# Altium footprint library domino-spring-clamp.PcbLib: 258 footprints (part 6 of 17)
Each footprint in its own frame and in the unit in brackets; x right, y up, seen from the top. Pads: shape width x height; smd on the part's side, far side on the other; paste and mask are expansions set on the pad; w line width, h text height; cw(c..) or ccw(c..) is an arc to the next point about the centre after c.
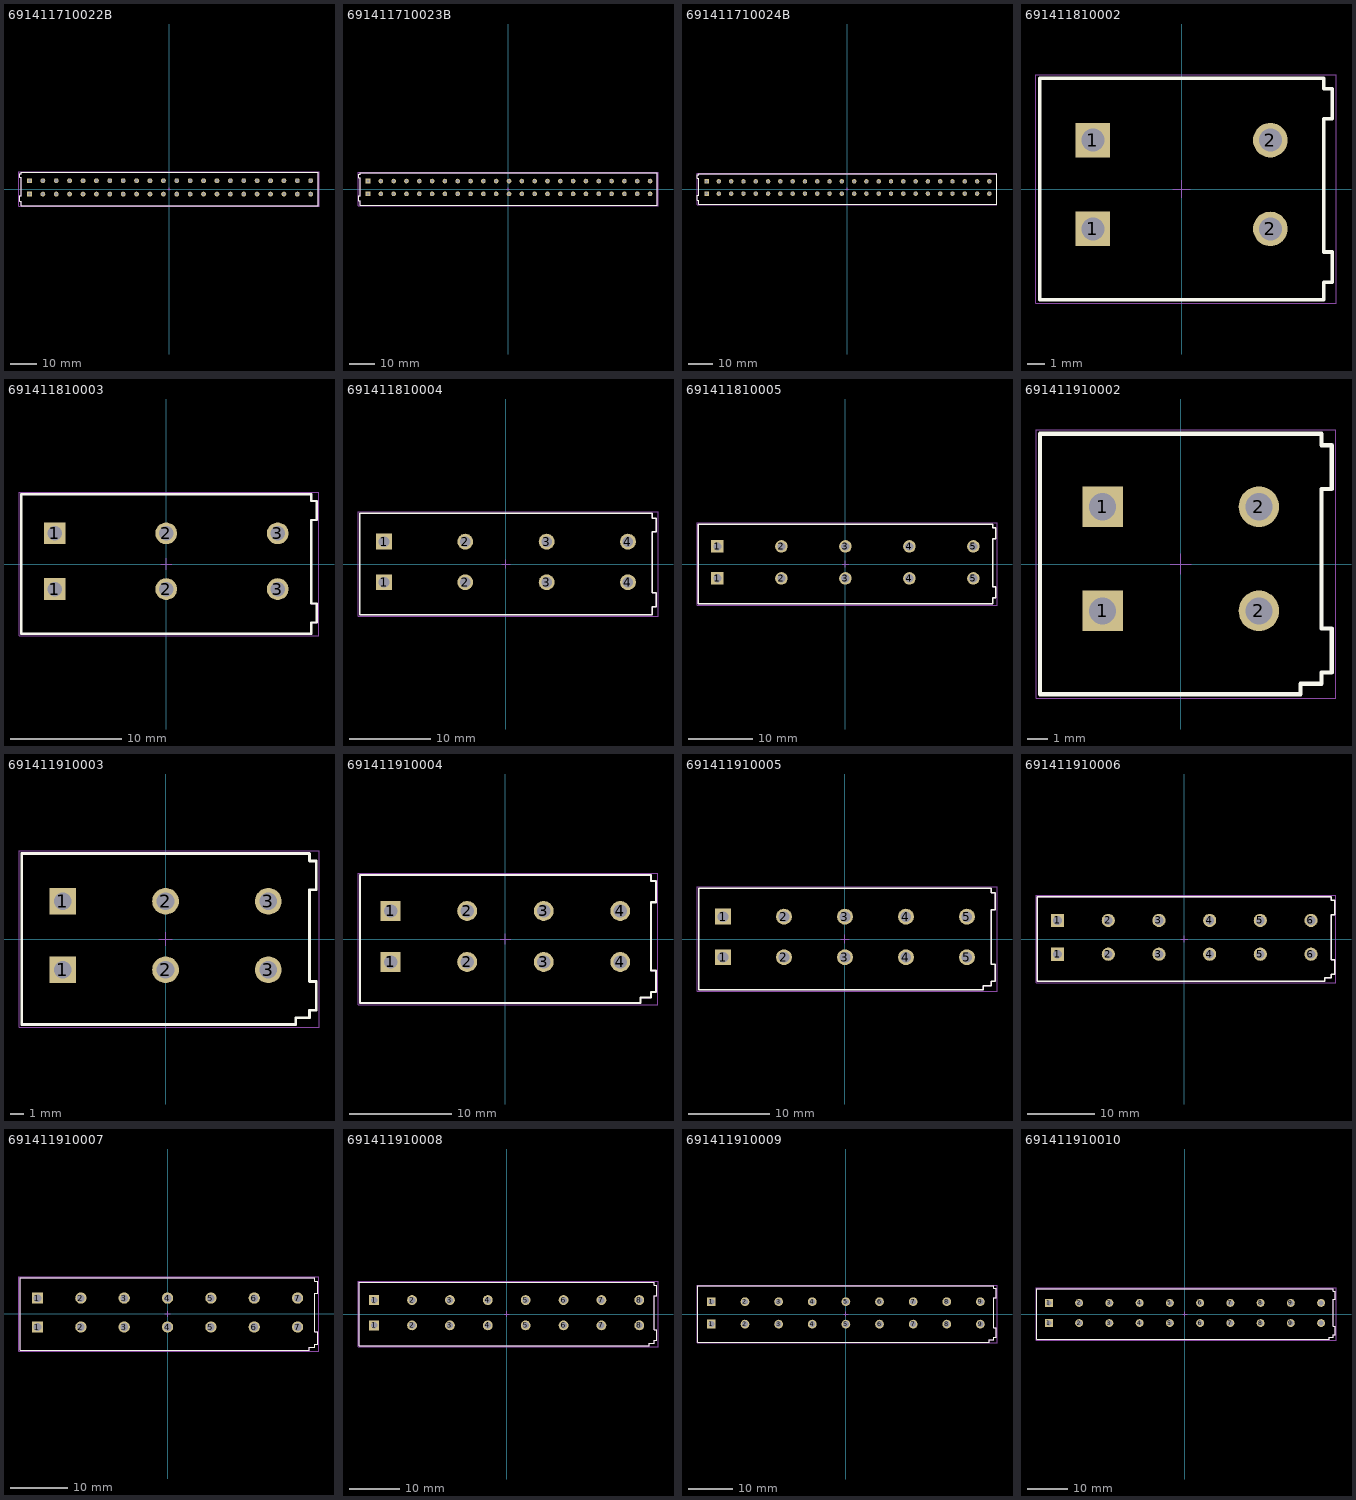
[diagram p5: the footprints below, top view; thin cyan lines are the x and y axes]

## 691411710022B [mm] "5.00 mm Screwless Horizontal Entry - 2.0 mm2 Wires, 22p"
height 15.25
pads (44):
  rect 1.8x1.8 hole 1.2: 1(-52.1,-1.9) 1(-52.1,3.1)
  round 1.8 hole 1.2: 2(-47.1,-1.9) 2(-47.1,3.1) 3(-42.1,-1.9) 3(-42.1,3.1) 4(-37.1,-1.9) 4(-37.1,3.1) 5(-32.1,-1.9) 5(-32.1,3.1) 6(-27.1,-1.9) 6(-27.1,3.1) 7(-22.1,-1.9) 7(-22.1,3.1) 8(-17.1,-1.9) 8(-17.1,3.1) 9(-12.1,-1.9) 9(-12.1,3.1) 10(-7.1,-1.9) 10(-7.1,3.1) 11(-2.1,-1.9) 11(-2.1,3.1) 12(2.9,-1.9) 12(2.9,3.1) 13(7.9,-1.9) 13(7.9,3.1) 14(12.9,-1.9) 14(12.9,3.1) 15(17.9,-1.9) 15(17.9,3.1) 16(22.9,-1.9) 16(22.9,3.1) 17(27.9,-1.9) 17(27.9,3.1) 18(32.9,-1.9) 18(32.9,3.1) 19(37.9,-1.9) 19(37.9,3.1) 20(42.9,-1.9) 20(42.9,3.1) 21(47.9,-1.9) 21(47.9,3.1) 22(52.9,-1.9) 22(52.9,3.1)
Top Overlay:
  lines w0.2: -55.8,-4.6 -55.8,-2.55 -55.2,-2.55 -55.2,4.3 -55.8,4.3 -55.8,5.7 -55.2,5.7 -55.2,6.3 55.8,6.3 55.8,-6.3 -55.2,-6.3 -55.2,-4.6 -55.8,-4.6
Mechanical 13:
  lines w0.1: -55.8,-4.6 -55.2,-4.6 -55.2,-6.3 55.8,-6.3 55.8,6.3 -55.2,6.3 -55.2,5.7 -55.8,5.7 -55.8,4.3 -55.2,4.3 -55.2,-2.55 -55.8,-2.55 -55.8,-4.6
Mechanical 15:
  lines w0.05: -0.5,0 0.5,0 ; 0,-0.5 0,0.5 ; -56,-6.5 -56,6.5 56,6.5 56,-6.5 -56,-6.5
3D body "691411710022B.stp": height 15.65, standoff -3.55, extent -55.8,-6.3 55.8,6.3

## 691411710023B [mm] "5.00 mm Screwless Horizontal Entry - 2.0 mm2 Wires, 23p"
height 15.25
pads (46):
  rect 1.8x1.8 hole 1.2: 1(-54.6,-1.9) 1(-54.6,3.1)
  round 1.8 hole 1.2: 2(-49.6,-1.9) 2(-49.6,3.1) 3(-44.6,-1.9) 3(-44.6,3.1) 4(-39.6,-1.9) 4(-39.6,3.1) 5(-34.6,-1.9) 5(-34.6,3.1) 6(-29.6,-1.9) 6(-29.6,3.1) 7(-24.6,-1.9) 7(-24.6,3.1) 8(-19.6,-1.9) 8(-19.6,3.1) 9(-14.6,-1.9) 9(-14.6,3.1) 10(-9.6,-1.9) 10(-9.6,3.1) 11(-4.6,-1.9) 11(-4.6,3.1) 12(0.4,-1.9) 12(0.4,3.1) 13(5.4,-1.9) 13(5.4,3.1) 14(10.4,-1.9) 14(10.4,3.1) 15(15.4,-1.9) 15(15.4,3.1) 16(20.4,-1.9) 16(20.4,3.1) 17(25.4,-1.9) 17(25.4,3.1) 18(30.4,-1.9) 18(30.4,3.1) 19(35.4,-1.9) 19(35.4,3.1) 20(40.4,-1.9) 20(40.4,3.1) 21(45.4,-1.9) 21(45.4,3.1) 22(50.4,-1.9) 22(50.4,3.1) 23(55.4,-1.9) 23(55.4,3.1)
Top Overlay:
  lines w0.2: -58.3,-4.6 -58.3,-2.55 -57.7,-2.55 -57.7,4.3 -58.3,4.3 -58.3,5.7 -57.7,5.7 -57.7,6.3 58.3,6.3 58.3,-6.3 -57.7,-6.3 -57.7,-4.6 -58.3,-4.6
Mechanical 13:
  lines w0.1: -58.3,-4.6 -57.7,-4.6 -57.7,-6.3 58.3,-6.3 58.3,6.3 -57.7,6.3 -57.7,5.7 -58.3,5.7 -58.3,4.3 -57.7,4.3 -57.7,-2.55 -58.3,-2.55 -58.3,-4.6
Mechanical 15:
  lines w0.05: -0.5,0 0.5,0 ; 0,-0.5 0,0.5 ; -58.5,-6.5 -58.5,6.5 58.5,6.5 58.5,-6.5 -58.5,-6.5
3D body "691411710023B.stp": height 15.65, standoff -3.55, extent -58.3,-6.3 58.3,6.3

## 691411710024B [mm] "5.00 mm Screwless Horizontal Entry - 2.0 mm2 Wires, 24p"
height 15.25
pads (48):
  rect 1.8x1.8 hole 1.2: 1(-57.1,-1.9) 1(-57.1,3.1)
  round 1.8 hole 1.2: 2(-52.1,-1.9) 2(-52.1,3.1) 3(-47.1,-1.9) 3(-47.1,3.1) 4(-42.1,-1.9) 4(-42.1,3.1) 5(-37.1,-1.9) 5(-37.1,3.1) 6(-32.1,-1.9) 6(-32.1,3.1) 7(-27.1,-1.9) 7(-27.1,3.1) 8(-22.1,-1.9) 8(-22.1,3.1) 9(-17.1,-1.9) 9(-17.1,3.1) 10(-12.1,-1.9) 10(-12.1,3.1) 11(-7.1,-1.9) 11(-7.1,3.1) 12(-2.1,-1.9) 12(-2.1,3.1) 13(2.9,-1.9) 13(2.9,3.1) 14(7.9,-1.9) 14(7.9,3.1) 15(12.9,-1.9) 15(12.9,3.1) 16(17.9,-1.9) 16(17.9,3.1) 17(22.9,-1.9) 17(22.9,3.1) 18(27.9,-1.9) 18(27.9,3.1) 19(32.9,-1.9) 19(32.9,3.1) 20(37.9,-1.9) 20(37.9,3.1) 21(42.9,-1.9) 21(42.9,3.1) 22(47.9,-1.9) 22(47.9,3.1) 23(52.9,-1.9) 23(52.9,3.1) 24(57.9,-1.9) 24(57.9,3.1)
Top Overlay:
  lines w0.2: -60.8,-4.6 -60.8,-2.55 -60.2,-2.55 -60.2,4.3 -60.8,4.3 -60.8,5.7 -60.2,5.7 -60.2,6.3 60.8,6.3 60.8,-6.3 -60.2,-6.3 -60.2,-4.6 -60.8,-4.6
Mechanical 13:
  lines w0.1: -60.8,-4.6 -60.2,-4.6 -60.2,-6.3 60.8,-6.3 60.8,6.3 -60.2,6.3 -60.2,5.7 -60.8,5.7 -60.8,4.3 -60.2,4.3 -60.2,-2.55 -60.8,-2.55 -60.8,-4.6
Mechanical 15:
  lines w0.05: -0.5,0 0.5,0 ; 0,-0.5 0,0.5 ; -61,-6.5 -61,6.5 61,6.5 61,-6.5 -61,-6.5
3D body "691411710024B.stp": height 15.65, standoff -3.55, extent -60.8,-6.3 60.8,6.3

## 691411810002 [mm] "10.00mm Horizontal Cable Entry Screwless, 02p"
height 13.9
pads (4):
  rect 1.95x1.95 hole 1.3: 1(-5,-2.25) 1(-5,2.75)
  round 1.95 hole 1.3: 2(5,-2.25) 2(5,2.75)
Top Overlay:
  lines w0.2: -8,-6.25 -8,6.25 8,6.25 8,5.65 8.5,5.65 8.5,3.95 8,3.95 8,-3.55 8.5,-3.55 8.5,-5.25 8,-5.25 8,-6.25 -8,-6.25
Mechanical 13:
  lines w0.1: -8,-6.25 8,-6.25 8,-5.25 8.5,-5.25 8.5,-3.55 8,-3.55 8,3.95 8.5,3.95 8.5,5.65 8,5.65 8,6.25 -8,6.25 -8,-6.25
Mechanical 15:
  lines w0.05: -0.5,0 0.5,0 ; 0,-0.5 0,0.5 ; -8.2,-6.45 -8.2,6.45 8.7,6.45 8.7,-6.45 -8.2,-6.45
3D body "691411810002.stp": height 14, standoff -3.5, extent -8,-6.25 8.5,6.25

## 691411810003 [mm] "10.00mm Horizontal Cable Entry Screwless, 03p"
height 13.9
pads (6):
  rect 1.95x1.95 hole 1.3: 1(-10,-2.25) 1(-10,2.75)
  round 1.95 hole 1.3: 2(0,-2.25) 2(0,2.75) 3(10,-2.25) 3(10,2.75)
Top Overlay:
  lines w0.2: -13,-6.25 13,-6.25 13,-5.25 13.5,-5.25 13.5,-3.55 13,-3.55 13,3.95 13.5,3.95 13.5,5.65 13,5.65 13,6.25 -13,6.25 -13,-6.25
Mechanical 13:
  lines w0.1: -13,-6.25 -13,6.25 13,6.25 13,5.65 13.5,5.65 13.5,3.95 13,3.95 13,-3.55 13.5,-3.55 13.5,-5.25 13,-5.25 13,-6.25 -13,-6.25
Mechanical 15:
  lines w0.05: -0.5,0 0.5,0 ; 0,-0.5 0,0.5 ; -13.2,-6.45 13.7,-6.45 13.7,6.45 -13.2,6.45 -13.2,-6.45
3D body "691411810003.stp": height 14, standoff -3.5, extent -13,-6.25 13.5,6.25

## 691411810004 [mm] "10.00mm Horizontal Cable Entry Screwless, 04p"
height 13.9
pads (8):
  rect 1.95x1.95 hole 1.3: 1(-15,-2.25) 1(-15,2.75)
  round 1.95 hole 1.3: 2(-5,-2.25) 2(-5,2.75) 3(5,-2.25) 3(5,2.75) 4(15,-2.25) 4(15,2.75)
Top Overlay:
  lines w0.2: -18,-6.25 18,-6.25 18,-5.25 18.5,-5.25 18.5,-3.55 18,-3.55 18,3.95 18.5,3.95 18.5,5.65 18,5.65 18,6.25 -18,6.25 -18,-6.25
Mechanical 13:
  lines w0.1: -18,-6.25 -18,6.25 18,6.25 18,5.65 18.5,5.65 18.5,3.95 18,3.95 18,-3.55 18.5,-3.55 18.5,-5.25 18,-5.25 18,-6.25 -18,-6.25
Mechanical 15:
  lines w0.05: -0.5,0 0.5,0 ; 0,-0.5 0,0.5 ; -18.2,-6.45 18.7,-6.45 18.7,6.45 -18.2,6.45 -18.2,-6.45
3D body "691411810004.stp": height 14, standoff -3.5, extent -18,-6.25 18.5,6.25

## 691411810005 [mm] "10.00mm Horizontal Cable Entry Screwless, 05p"
height 13.9
pads (10):
  rect 1.95x1.95 hole 1.3: 1(-20,-2.25) 1(-20,2.75)
  round 1.95 hole 1.3: 2(-10,-2.25) 2(-10,2.75) 3(0,-2.25) 3(0,2.75) 4(10,-2.25) 4(10,2.75) 5(20,-2.25) 5(20,2.75)
Top Overlay:
  lines w0.2: -23,-6.25 -23,6.25 23,6.25 23,5.65 23.5,5.65 23.5,3.95 23,3.95 23,-3.55 23.5,-3.55 23.5,-5.25 23,-5.25 23,-6.25 -23,-6.25
Mechanical 13:
  lines w0.1: -23,-6.25 23,-6.25 23,-5.25 23.5,-5.25 23.5,-3.55 23,-3.55 23,3.95 23.5,3.95 23.5,5.65 23,5.65 23,6.25 -23,6.25 -23,-6.25
Mechanical 15:
  lines w0.05: -0.5,0 0.5,0 ; 0,-0.5 0,0.5 ; -23.2,-6.45 -23.2,6.45 23.7,6.45 23.7,-6.45 -23.2,-6.45
3D body "691411810005.stp": height 14, standoff -3.5, extent -23,-6.25 23.5,6.25

## 691411910002 [mm] "7.50 mm Screwless Horizontal Entry, 2p"
height 13.9
pads (4):
  rect 1.95x1.95 hole 1.3: 1(-3.75,-2.25) 1(-3.75,2.75)
  round 1.95 hole 1.3: 2(3.75,-2.25) 2(3.75,2.75)
Top Overlay:
  lines w0.2: -6.75,-6.25 -6.75,6.25 6.75,6.25 6.75,5.7 7.25,5.7 7.25,3.6 6.75,3.6 6.75,-3.1 7.25,-3.1 7.25,-5.2 6.75,-5.2 6.75,-5.75 5.75,-5.75 5.75,-6.25 -6.75,-6.25
Mechanical 13:
  lines w0.1: -6.75,-6.25 5.75,-6.25 5.75,-5.75 6.75,-5.75 6.75,-5.2 7.25,-5.2 7.25,-3.1 6.75,-3.1 6.75,3.6 7.25,3.6 7.25,5.7 6.75,5.7 6.75,6.25 -6.75,6.25 -6.75,-6.25
Mechanical 15:
  lines w0.05: -0.5,0 0.5,0 ; 0,-0.5 0,0.5 ; -6.95,-6.45 -6.95,6.45 7.45,6.45 7.45,-6.45 -6.95,-6.45
3D body "691411910002.stp": height 13.95, standoff -3.55, extent -6.75,-6.25 7.25,6.25

## 691411910003 [mm] "7.50 mm Screwless Horizontal Entry, 3p"
height 13.9
pads (6):
  rect 1.95x1.95 hole 1.3: 1(-7.5,-2.25) 1(-7.5,2.75)
  round 1.95 hole 1.3: 2(0,-2.25) 2(0,2.75) 3(7.5,-2.25) 3(7.5,2.75)
Top Overlay:
  lines w0.2: -10.5,-6.25 9.5,-6.25 9.5,-5.75 10.5,-5.75 10.5,-5.2 11,-5.2 11,-3.1 10.5,-3.1 10.5,3.6 11,3.6 11,5.7 10.5,5.7 10.5,6.25 -10.5,6.25 -10.5,-6.25
Mechanical 13:
  lines w0.1: -10.5,-6.25 -10.5,6.25 10.5,6.25 10.5,5.7 11,5.7 11,3.6 10.5,3.6 10.5,-3.1 11,-3.1 11,-5.2 10.5,-5.2 10.5,-5.75 9.5,-5.75 9.5,-6.25 -10.5,-6.25
Mechanical 15:
  lines w0.05: -0.5,0 0.5,0 ; 0,-0.5 0,0.5 ; -10.7,-6.45 11.2,-6.45 11.2,6.45 -10.7,6.45 -10.7,-6.45
3D body "691411910003.stp": height 13.95, standoff -3.55, extent -10.5,-6.25 11,6.25

## 691411910004 [mm] "7.50 mm Screwless Horizontal Entry, 4p"
height 13.9
pads (8):
  rect 1.95x1.95 hole 1.3: 1(-11.25,-2.25) 1(-11.25,2.75)
  round 1.95 hole 1.3: 2(-3.75,-2.25) 2(-3.75,2.75) 3(3.75,-2.25) 3(3.75,2.75) 4(11.25,-2.25) 4(11.25,2.75)
Top Overlay:
  lines w0.2: -14.25,-6.25 -14.25,6.25 14.25,6.25 14.25,5.7 14.75,5.7 14.75,3.6 14.25,3.6 14.25,-3.1 14.75,-3.1 14.75,-5.2 14.25,-5.2 14.25,-5.75 13.25,-5.75 13.25,-6.25 -14.25,-6.25
Mechanical 13:
  lines w0.1: -14.25,-6.25 13.25,-6.25 13.25,-5.75 14.25,-5.75 14.25,-5.2 14.75,-5.2 14.75,-3.1 14.25,-3.1 14.25,3.6 14.75,3.6 14.75,5.7 14.25,5.7 14.25,6.25 -14.25,6.25 -14.25,-6.25
Mechanical 15:
  lines w0.05: -0.5,0 0.5,0 ; 0,-0.5 0,0.5 ; -14.45,-6.45 -14.45,6.45 14.95,6.45 14.95,-6.45 -14.45,-6.45
3D body "691411910004.stp": height 13.95, standoff -3.55, extent -14.25,-6.25 14.75,6.25

## 691411910005 [mm] "7.50 mm Screwless Horizontal Entry, 5p"
height 13.9
pads (10):
  rect 1.95x1.95 hole 1.3: 1(-15,-2.25) 1(-15,2.75)
  round 1.95 hole 1.3: 2(-7.5,-2.25) 2(-7.5,2.75) 3(0,-2.25) 3(0,2.75) 4(7.5,-2.25) 4(7.5,2.75) 5(15,-2.25) 5(15,2.75)
Top Overlay:
  lines w0.2: -18,-6.25 -18,6.25 18,6.25 18,5.7 18.5,5.7 18.5,3.6 18,3.6 18,-3.1 18.5,-3.1 18.5,-5.2 18,-5.2 18,-5.75 17,-5.75 17,-6.25 -18,-6.25
Mechanical 13:
  lines w0.1: -18,-6.25 17,-6.25 17,-5.75 18,-5.75 18,-5.2 18.5,-5.2 18.5,-3.1 18,-3.1 18,3.6 18.5,3.6 18.5,5.7 18,5.7 18,6.25 -18,6.25 -18,-6.25
Mechanical 15:
  lines w0.05: -0.5,0 0.5,0 ; 0,-0.5 0,0.5 ; -18.2,-6.45 -18.2,6.45 18.7,6.45 18.7,-6.45 -18.2,-6.45
3D body "691411910005.stp": height 13.95, standoff -3.55, extent -18,-6.25 18.5,6.25

## 691411910006 [mm] "7.50 mm Screwless Horizontal Entry, 6p"
height 13.9
pads (12):
  rect 1.95x1.95 hole 1.3: 1(-18.75,-2.25) 1(-18.75,2.75)
  round 1.95 hole 1.3: 2(-11.25,-2.25) 2(-11.25,2.75) 3(-3.75,-2.25) 3(-3.75,2.75) 4(3.75,-2.25) 4(3.75,2.75) 5(11.25,-2.25) 5(11.25,2.75) 6(18.75,-2.25) 6(18.75,2.75)
Top Overlay:
  lines w0.2: -21.75,-6.25 20.75,-6.25 20.75,-5.75 21.75,-5.75 21.75,-5.2 22.25,-5.2 22.25,-3.1 21.75,-3.1 21.75,3.6 22.25,3.6 22.25,5.7 21.75,5.7 21.75,6.25 -21.75,6.25 -21.75,-6.25
Mechanical 13:
  lines w0.1: -21.75,-6.25 -21.75,6.25 21.75,6.25 21.75,5.7 22.25,5.7 22.25,3.6 21.75,3.6 21.75,-3.1 22.25,-3.1 22.25,-5.2 21.75,-5.2 21.75,-5.75 20.75,-5.75 20.75,-6.25 -21.75,-6.25
Mechanical 15:
  lines w0.05: -0.5,0 0.5,0 ; 0,-0.5 0,0.5 ; -21.95,-6.45 22.45,-6.45 22.45,6.45 -21.95,6.45 -21.95,-6.45
3D body "691411910006.stp": height 13.95, standoff -3.55, extent -21.75,-6.25 22.25,6.25

## 691411910007 [mm] "7.50 mm Screwless Horizontal Entry, 7p"
height 13.9
pads (14):
  rect 1.95x1.95 hole 1.3: 1(-22.5,-2.25) 1(-22.5,2.75)
  round 1.95 hole 1.3: 2(-15,-2.25) 2(-15,2.75) 3(-7.5,-2.25) 3(-7.5,2.75) 4(0,-2.25) 4(0,2.75) 5(7.5,-2.25) 5(7.5,2.75) 6(15,-2.25) 6(15,2.75) 7(22.5,-2.25) 7(22.5,2.75)
Top Overlay:
  lines w0.2: -25.5,-6.25 -25.5,6.25 25.5,6.25 25.5,5.7 26,5.7 26,3.6 25.5,3.6 25.5,-3.1 26,-3.1 26,-5.2 25.5,-5.2 25.5,-5.75 24.5,-5.75 24.5,-6.25 -25.5,-6.25
Mechanical 13:
  lines w0.1: -25.5,-6.25 24.5,-6.25 24.5,-5.75 25.5,-5.75 25.5,-5.2 26,-5.2 26,-3.1 25.5,-3.1 25.5,3.6 26,3.6 26,5.7 25.5,5.7 25.5,6.25 -25.5,6.25 -25.5,-6.25
Mechanical 15:
  lines w0.05: -0.5,0 0.5,0 ; 0,-0.5 0,0.5 ; -25.7,-6.45 -25.7,6.45 26.2,6.45 26.2,-6.45 -25.7,-6.45
3D body "691411910007.stp": height 13.95, standoff -3.55, extent -25.5,-6.25 26,6.25

## 691411910008 [mm] "7.50 mm Screwless Horizontal Entry, 8p"
height 13.9
pads (16):
  rect 1.95x1.95 hole 1.3: 1(-26.25,-2.25) 1(-26.25,2.75)
  round 1.95 hole 1.3: 2(-18.75,-2.25) 2(-18.75,2.75) 3(-11.25,-2.25) 3(-11.25,2.75) 4(-3.75,-2.25) 4(-3.75,2.75) 5(3.75,-2.25) 5(3.75,2.75) 6(11.25,-2.25) 6(11.25,2.75) 7(18.75,-2.25) 7(18.75,2.75) 8(26.25,-2.25) 8(26.25,2.75)
Top Overlay:
  lines w0.2: -29.25,-6.25 -29.25,6.25 29.25,6.25 29.25,5.7 29.75,5.7 29.75,3.6 29.25,3.6 29.25,-3.1 29.75,-3.1 29.75,-5.2 29.25,-5.2 29.25,-5.75 28.25,-5.75 28.25,-6.25 -29.25,-6.25
Mechanical 13:
  lines w0.1: -29.25,-6.25 28.25,-6.25 28.25,-5.75 29.25,-5.75 29.25,-5.2 29.75,-5.2 29.75,-3.1 29.25,-3.1 29.25,3.6 29.75,3.6 29.75,5.7 29.25,5.7 29.25,6.25 -29.25,6.25 -29.25,-6.25
Mechanical 15:
  lines w0.05: -0.5,0 0.5,0 ; 0,-0.5 0,0.5 ; -29.45,-6.45 -29.45,6.45 29.95,6.45 29.95,-6.45 -29.45,-6.45
3D body "691411910008.stp": height 13.95, standoff -3.55, extent -29.25,-6.25 29.75,6.25

## 691411910009 [mm] "7.50 mm Screwless Horizontal Entry, 9p"
height 13.9
pads (18):
  rect 1.95x1.95 hole 1.3: 1(-30,-2.25) 1(-30,2.75)
  round 1.95 hole 1.3: 2(-22.5,-2.25) 2(-22.5,2.75) 3(-15,-2.25) 3(-15,2.75) 4(-7.5,-2.25) 4(-7.5,2.75) 5(0,-2.25) 5(0,2.75) 6(7.5,-2.25) 6(7.5,2.75) 7(15,-2.25) 7(15,2.75) 8(22.5,-2.25) 8(22.5,2.75) 9(30,-2.25) 9(30,2.75)
Top Overlay:
  lines w0.2: -33,-6.25 32,-6.25 32,-5.75 33,-5.75 33,-5.2 33.5,-5.2 33.5,-3.1 33,-3.1 33,3.6 33.5,3.6 33.5,5.7 33,5.7 33,6.25 -33,6.25 -33,-6.25
Mechanical 13:
  lines w0.1: -33,-6.25 -33,6.25 33,6.25 33,5.7 33.5,5.7 33.5,3.6 33,3.6 33,-3.1 33.5,-3.1 33.5,-5.2 33,-5.2 33,-5.75 32,-5.75 32,-6.25 -33,-6.25
Mechanical 15:
  lines w0.05: -0.5,0 0.5,0 ; 0,-0.5 0,0.5 ; -33.2,-6.45 33.7,-6.45 33.7,6.45 -33.2,6.45 -33.2,-6.45
3D body "691411910009.stp": height 13.95, standoff -3.55, extent -33,-6.25 33.5,6.25

## 691411910010 [mm] "7.50 mm Screwless Horizontal Entry, 10p"
height 13.9
pads (20):
  rect 1.95x1.95 hole 1.3: 1(-33.75,-2.25) 1(-33.75,2.75)
  round 1.95 hole 1.3: 2(-26.25,-2.25) 2(-26.25,2.75) 3(-18.75,-2.25) 3(-18.75,2.75) 4(-11.25,-2.25) 4(-11.25,2.75) 5(-3.75,-2.25) 5(-3.75,2.75) 6(3.75,-2.25) 6(3.75,2.75) 7(11.25,-2.25) 7(11.25,2.75) 8(18.75,-2.25) 8(18.75,2.75) 9(26.25,-2.25) 9(26.25,2.75) 10(33.75,-2.25) 10(33.75,2.75)
Top Overlay:
  lines w0.2: -36.75,-6.25 -36.75,6.25 36.75,6.25 36.75,5.7 37.25,5.7 37.25,3.6 36.75,3.6 36.75,-3.1 37.25,-3.1 37.25,-5.2 36.75,-5.2 36.75,-5.75 35.75,-5.75 35.75,-6.25 -36.75,-6.25
Mechanical 13:
  lines w0.1: -36.75,-6.25 35.75,-6.25 35.75,-5.75 36.75,-5.75 36.75,-5.2 37.25,-5.2 37.25,-3.1 36.75,-3.1 36.75,3.6 37.25,3.6 37.25,5.7 36.75,5.7 36.75,6.25 -36.75,6.25 -36.75,-6.25
Mechanical 15:
  lines w0.05: -0.5,0 0.5,0 ; 0,-0.5 0,0.5 ; -36.95,-6.45 -36.95,6.45 37.45,6.45 37.45,-6.45 -36.95,-6.45
3D body "691411910010.stp": height 13.95, standoff -3.55, extent -36.75,-6.25 37.25,6.25